# Altium integrated library Weidmueller_OMNIMATE_Signal.IntLib: 2550 symbols (part 24 of 45)
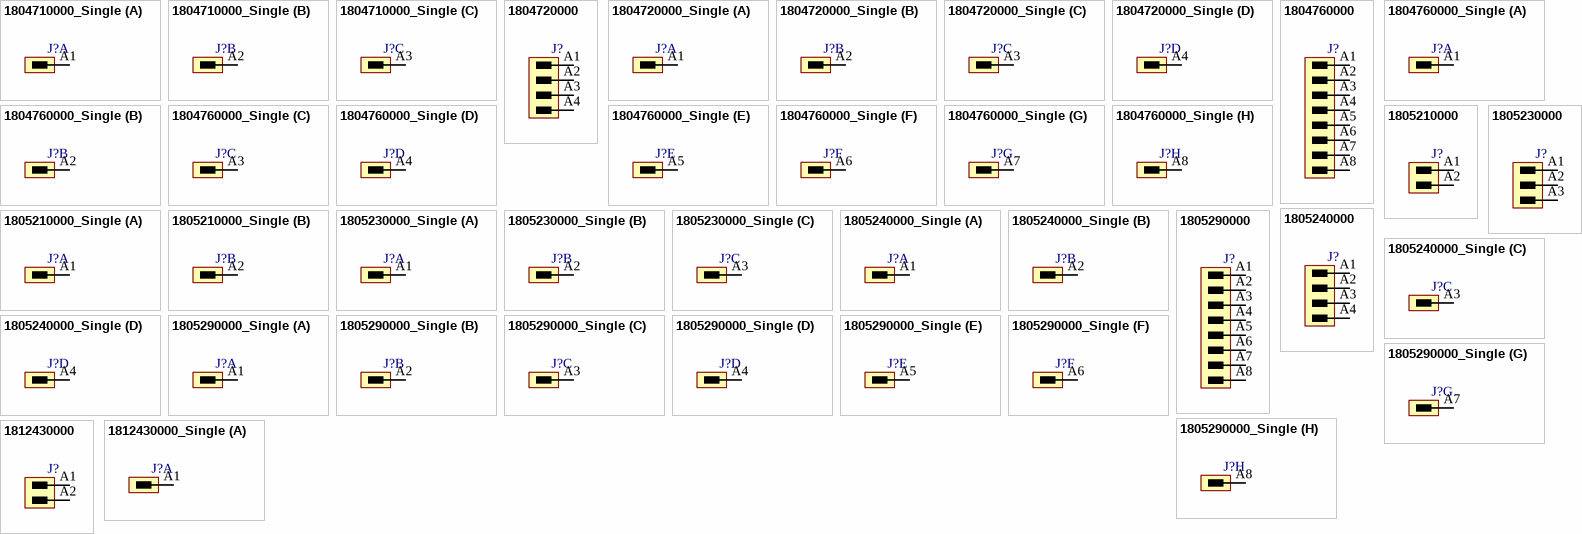
[diagram p234: symbols 1804710000_Single to 1812430000_Single]

## 1804760000_Single
designator J?
OMNIMATE Signal - series BL/SL 3.50; PartNumber: 1804760000; Manufacturer: Weidmueller; Short_text_for_material: SL-SMT 3.50/08/180LF 1.5SN BK BX; Side_termination_characteristic: Solder flange; Mounting_onto_the_PCB: Reflow solder connection; Pitch_mm: 3.5 mm; Pitch_inch: 0.138 inch; No_of_poles: 8; Outgoing_elbow: 180°; Solder_pin_length_mm: 1.5 mm; Contact_material: CuSn; Contact_surface: tinned; Insulating_material: LCP GF; UL_94_flammability_rating: V-0; Rated_voltage_for_surge_voltage_class_pollution_degree_II_2: 320 V; Rated_current_min_no_of_poles_TU_20_deg_C: 19 A; Rated_voltage_use_group_B_UL_1059: 300 V; Rated_current_use_group_B_UL_1059: 10 A; PackageReference: SL_SMT_3_5_180LF_08; Colour: Black; Packaging: Box; Qty: 50 PCS; Revision: V1; ComponentLink1Description: Manufacturer URL; ComponentLink1URL: http://www.weidmueller.com/; ComponentLink2Description: URL Link1; ComponentLink2URL: http://catalog.weidmueller.com/catalog/Start.do?localeId=en&ObjectID=1804760000
footprint SL_SMT_3_5_180LF_08 (OMNIMATE Signal - Serie BL/SL 3.50  SL-SMT 3.50/08/180LF 1.5)
part A pins: A1
part B pins: A2
part C pins: A3
part D pins: A4
part E pins: A5
part F pins: A6
part G pins: A7
part H pins: A8

## 1805210000
designator J?
OMNIMATE Signal - series BL/SL 3.50; PartNumber: 1805210000; Manufacturer: Weidmueller; Short_text_for_material: SL-SMT 3.50/02/180LF 1.5SN BK RL; Side_termination_characteristic: Solder flange; Mounting_onto_the_PCB: Reflow solder connection; Pitch_mm: 3.5 mm; Pitch_inch: 0.138 inch; No_of_poles: 2; Outgoing_elbow: 180°; Solder_pin_length_mm: 1.5 mm; Contact_material: CuSn; Contact_surface: tinned; Insulating_material: LCP GF; UL_94_flammability_rating: V-0; Rated_voltage_for_surge_voltage_class_pollution_degree_II_2: 320 V; Rated_current_min_no_of_poles_TU_20_deg_C: 15 A; Rated_voltage_use_group_B_UL_1059: 300 V; Rated_current_use_group_B_UL_1059: 10 A; PackageReference: SL_SMT_3_5_180LF_02; Colour: Black; Packaging: Tape; Qty: 265 PCS; Revision: V1; ComponentLink1Description: Manufacturer URL; ComponentLink1URL: http://www.weidmueller.com/; ComponentLink2Description: URL Link1; ComponentLink2URL: http://catalog.weidmueller.com/catalog/Start.do?localeId=en&ObjectID=1805210000
footprint SL_SMT_3_5_180LF_02 (OMNIMATE Signal - Serie BL/SL 3.50  SL-SMT 3.50/02/180LF 1.5)
pins: A1, A2

## 1805210000_Single
designator J?
OMNIMATE Signal - series BL/SL 3.50; PartNumber: 1805210000; Manufacturer: Weidmueller; Short_text_for_material: SL-SMT 3.50/02/180LF 1.5SN BK RL; Side_termination_characteristic: Solder flange; Mounting_onto_the_PCB: Reflow solder connection; Pitch_mm: 3.5 mm; Pitch_inch: 0.138 inch; No_of_poles: 2; Outgoing_elbow: 180°; Solder_pin_length_mm: 1.5 mm; Contact_material: CuSn; Contact_surface: tinned; Insulating_material: LCP GF; UL_94_flammability_rating: V-0; Rated_voltage_for_surge_voltage_class_pollution_degree_II_2: 320 V; Rated_current_min_no_of_poles_TU_20_deg_C: 15 A; Rated_voltage_use_group_B_UL_1059: 300 V; Rated_current_use_group_B_UL_1059: 10 A; PackageReference: SL_SMT_3_5_180LF_02; Colour: Black; Packaging: Tape; Qty: 265 PCS; Revision: V1; ComponentLink1Description: Manufacturer URL; ComponentLink1URL: http://www.weidmueller.com/; ComponentLink2Description: URL Link1; ComponentLink2URL: http://catalog.weidmueller.com/catalog/Start.do?localeId=en&ObjectID=1805210000
footprint SL_SMT_3_5_180LF_02 (OMNIMATE Signal - Serie BL/SL 3.50  SL-SMT 3.50/02/180LF 1.5)
part A pins: A1
part B pins: A2

## 1805230000
designator J?
OMNIMATE Signal - series BL/SL 3.50; PartNumber: 1805230000; Manufacturer: Weidmueller; Short_text_for_material: SL-SMT 3.50/03/180LF 1.5SN BK RL; Side_termination_characteristic: Solder flange; Mounting_onto_the_PCB: Reflow solder connection; Pitch_mm: 3.5 mm; Pitch_inch: 0.138 inch; No_of_poles: 3; Outgoing_elbow: 180°; Solder_pin_length_mm: 1.5 mm; Contact_surface: tinned; Insulating_material: LCP GF; UL_94_flammability_rating: V-0; Rated_voltage_for_surge_voltage_class_pollution_degree_II_2: 320 V; Rated_current_min_no_of_poles_TU_20_deg_C: 15 A; Rated_voltage_use_group_B_UL_1059: 300 V; Rated_current_use_group_B_UL_1059: 10 A; PackageReference: SL_SMT_3_5_180LF_03; Colour: Black; Packaging: Tape; Qty: 265 PCS; Revision: V1; ComponentLink1Description: Manufacturer URL; ComponentLink1URL: http://www.weidmueller.com/; ComponentLink2Description: URL Link1; ComponentLink2URL: http://catalog.weidmueller.com/catalog/Start.do?localeId=en&ObjectID=1805230000
footprint SL_SMT_3_5_180LF_03 (OMNIMATE Signal - Serie BL/SL 3.50  SL-SMT 3.50/03/180LF 1.5)
pins: A1, A2, A3

## 1805230000_Single
designator J?
OMNIMATE Signal - series BL/SL 3.50; PartNumber: 1805230000; Manufacturer: Weidmueller; Short_text_for_material: SL-SMT 3.50/03/180LF 1.5SN BK RL; Side_termination_characteristic: Solder flange; Mounting_onto_the_PCB: Reflow solder connection; Pitch_mm: 3.5 mm; Pitch_inch: 0.138 inch; No_of_poles: 3; Outgoing_elbow: 180°; Solder_pin_length_mm: 1.5 mm; Contact_surface: tinned; Insulating_material: LCP GF; UL_94_flammability_rating: V-0; Rated_voltage_for_surge_voltage_class_pollution_degree_II_2: 320 V; Rated_current_min_no_of_poles_TU_20_deg_C: 15 A; Rated_voltage_use_group_B_UL_1059: 300 V; Rated_current_use_group_B_UL_1059: 10 A; PackageReference: SL_SMT_3_5_180LF_03; Colour: Black; Packaging: Tape; Qty: 265 PCS; Revision: V1; ComponentLink1Description: Manufacturer URL; ComponentLink1URL: http://www.weidmueller.com/; ComponentLink2Description: URL Link1; ComponentLink2URL: http://catalog.weidmueller.com/catalog/Start.do?localeId=en&ObjectID=1805230000
footprint SL_SMT_3_5_180LF_03 (OMNIMATE Signal - Serie BL/SL 3.50  SL-SMT 3.50/03/180LF 1.5)
part A pins: A1
part B pins: A2
part C pins: A3

## 1805240000
designator J?
OMNIMATE Signal - series BL/SL 3.50; PartNumber: 1805240000; Manufacturer: Weidmueller; Short_text_for_material: SL-SMT 3.50/04/180LF 1.5SN BK RL; Side_termination_characteristic: Solder flange; Mounting_onto_the_PCB: Reflow solder connection; Pitch_mm: 3.5 mm; Pitch_inch: 0.138 inch; No_of_poles: 4; Outgoing_elbow: 180°; Solder_pin_length_mm: 1.5 mm; Contact_surface: tinned; Insulating_material: LCP GF; UL_94_flammability_rating: V-0; Rated_voltage_for_surge_voltage_class_pollution_degree_II_2: 320 V; Rated_current_min_no_of_poles_TU_20_deg_C: 15 A; Rated_voltage_use_group_B_UL_1059: 300 V; Rated_current_use_group_B_UL_1059: 10 A; PackageReference: SL_SMT_3_5_180LF_04; Colour: Black; Packaging: Tape; Qty: 265 PCS; Revision: V1; ComponentLink1Description: Manufacturer URL; ComponentLink1URL: http://www.weidmueller.com/; ComponentLink2Description: URL Link1; ComponentLink2URL: http://catalog.weidmueller.com/catalog/Start.do?localeId=en&ObjectID=1805240000
footprint SL_SMT_3_5_180LF_04 (OMNIMATE Signal - Serie BL/SL 3.50  SL-SMT 3.50/04/180LF 1.5)
pins: A1, A2, A3, A4

## 1805240000_Single
designator J?
OMNIMATE Signal - series BL/SL 3.50; PartNumber: 1805240000; Manufacturer: Weidmueller; Short_text_for_material: SL-SMT 3.50/04/180LF 1.5SN BK RL; Side_termination_characteristic: Solder flange; Mounting_onto_the_PCB: Reflow solder connection; Pitch_mm: 3.5 mm; Pitch_inch: 0.138 inch; No_of_poles: 4; Outgoing_elbow: 180°; Solder_pin_length_mm: 1.5 mm; Contact_surface: tinned; Insulating_material: LCP GF; UL_94_flammability_rating: V-0; Rated_voltage_for_surge_voltage_class_pollution_degree_II_2: 320 V; Rated_current_min_no_of_poles_TU_20_deg_C: 15 A; Rated_voltage_use_group_B_UL_1059: 300 V; Rated_current_use_group_B_UL_1059: 10 A; PackageReference: SL_SMT_3_5_180LF_04; Colour: Black; Packaging: Tape; Qty: 265 PCS; Revision: V1; ComponentLink1Description: Manufacturer URL; ComponentLink1URL: http://www.weidmueller.com/; ComponentLink2Description: URL Link1; ComponentLink2URL: http://catalog.weidmueller.com/catalog/Start.do?localeId=en&ObjectID=1805240000
footprint SL_SMT_3_5_180LF_04 (OMNIMATE Signal - Serie BL/SL 3.50  SL-SMT 3.50/04/180LF 1.5)
part A pins: A1
part B pins: A2
part C pins: A3
part D pins: A4

## 1805290000
designator J?
OMNIMATE Signal - series BL/SL 3.50; PartNumber: 1805290000; Manufacturer: Weidmueller; Short_text_for_material: SL-SMT 3.50/08/180LF 1.5SN BK RL; Side_termination_characteristic: Solder flange; Mounting_onto_the_PCB: Reflow solder connection; Pitch_mm: 3.5 mm; Pitch_inch: 0.138 inch; No_of_poles: 8; Outgoing_elbow: 180°; Solder_pin_length_mm: 1.5 mm; Contact_surface: tinned; Insulating_material: LCP GF; UL_94_flammability_rating: V-0; Rated_voltage_for_surge_voltage_class_pollution_degree_II_2: 320 V; Rated_current_min_no_of_poles_TU_20_deg_C: 15 A; Rated_voltage_use_group_B_UL_1059: 300 V; Rated_current_use_group_B_UL_1059: 10 A; PackageReference: SL_SMT_3_5_180LF_08; Colour: Black; Packaging: Tape; Qty: 265 PCS; Revision: V1; ComponentLink1Description: Manufacturer URL; ComponentLink1URL: http://www.weidmueller.com/; ComponentLink2Description: URL Link1; ComponentLink2URL: http://catalog.weidmueller.com/catalog/Start.do?localeId=en&ObjectID=1805290000
footprint SL_SMT_3_5_180LF_08 (OMNIMATE Signal - Serie BL/SL 3.50  SL-SMT 3.50/08/180LF 1.5)
pins: A1, A2, A3, A4, A5, A6, A7, A8

## 1805290000_Single
designator J?
OMNIMATE Signal - series BL/SL 3.50; PartNumber: 1805290000; Manufacturer: Weidmueller; Short_text_for_material: SL-SMT 3.50/08/180LF 1.5SN BK RL; Side_termination_characteristic: Solder flange; Mounting_onto_the_PCB: Reflow solder connection; Pitch_mm: 3.5 mm; Pitch_inch: 0.138 inch; No_of_poles: 8; Outgoing_elbow: 180°; Solder_pin_length_mm: 1.5 mm; Contact_surface: tinned; Insulating_material: LCP GF; UL_94_flammability_rating: V-0; Rated_voltage_for_surge_voltage_class_pollution_degree_II_2: 320 V; Rated_current_min_no_of_poles_TU_20_deg_C: 15 A; Rated_voltage_use_group_B_UL_1059: 300 V; Rated_current_use_group_B_UL_1059: 10 A; PackageReference: SL_SMT_3_5_180LF_08; Colour: Black; Packaging: Tape; Qty: 265 PCS; Revision: V1; ComponentLink1Description: Manufacturer URL; ComponentLink1URL: http://www.weidmueller.com/; ComponentLink2Description: URL Link1; ComponentLink2URL: http://catalog.weidmueller.com/catalog/Start.do?localeId=en&ObjectID=1805290000
footprint SL_SMT_3_5_180LF_08 (OMNIMATE Signal - Serie BL/SL 3.50  SL-SMT 3.50/08/180LF 1.5)
part A pins: A1
part B pins: A2
part C pins: A3
part D pins: A4
part E pins: A5
part F pins: A6
part G pins: A7
part H pins: A8

## 1812430000
designator J?
OMNIMATE Signal - series BL/SL 5.08; PartNumber: 1812430000; Manufacturer: Weidmueller; Short_text_for_material: SL-SMART 5.0X/02/90 1.5SN BK RL; Side_termination_characteristic: open side; Mounting_onto_the_PCB: Reflow solder connection; Pitch_mm: 5 mm; Pitch_inch: 0.197 inch; No_of_poles: 2; Outgoing_elbow: 90°; Solder_pin_length_mm: 1.5 mm; Contact_material: CuSn; Contact_surface: tinned; Insulating_material: LCP GF; UL_94_flammability_rating: V-0; Rated_voltage_for_surge_voltage_class_pollution_degree_II_2: 400 V; Rated_current_min_no_of_poles_TU_20_deg_C: 19 A; Rated_voltage_use_group_B_UL_1059: 300 V; Rated_current_use_group_B_UL_1059: 15 A; PackageReference: SL_SMarT_5_0x_90_02; Colour: Black; Packaging: Tape; Qty: 350 PCS; Revision: V1; ComponentLink1Description: Manufacturer URL; ComponentLink1URL: http://www.weidmueller.com/; ComponentLink2Description: URL Link1; ComponentLink2URL: http://catalog.weidmueller.com/catalog/Start.do?localeId=en&ObjectID=1812430000
footprint SL_SMarT_5_0x_90_02 (OMNIMATE Signal - Serie BL/SL 5.08  SL-SMART 5.0X/02/90 1.5)
pins: A1, A2

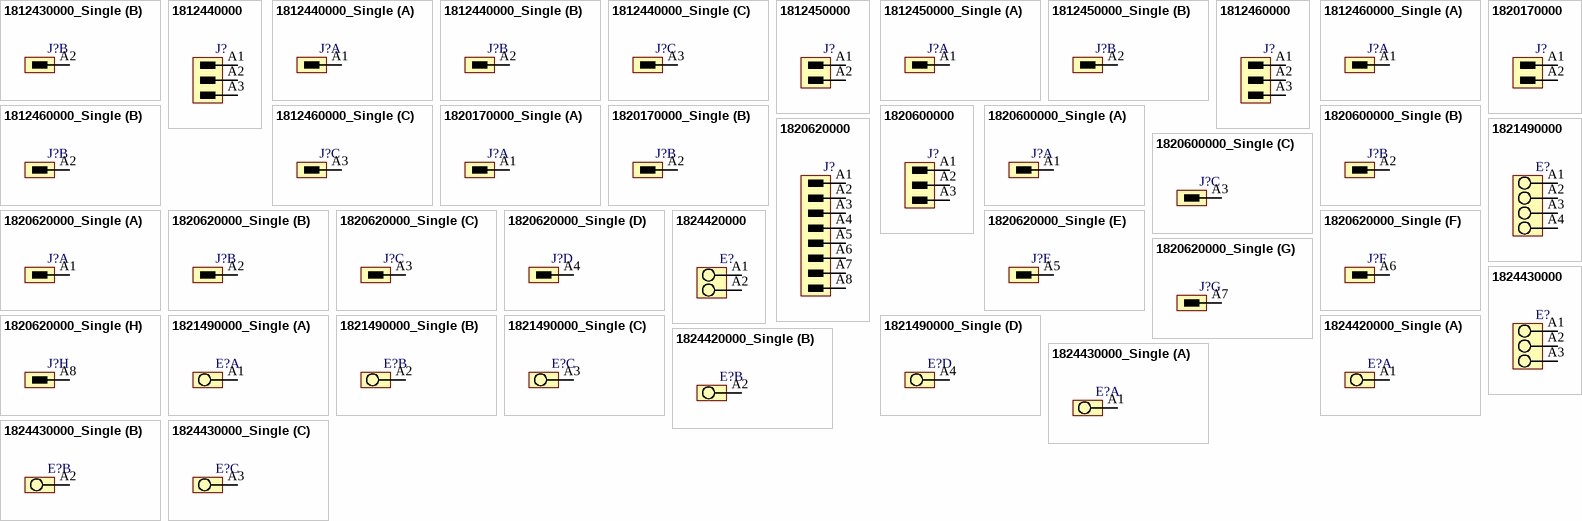
[diagram p126: symbols 1812430000_Single to 1824430000_Single]

## 1812430000_Single
designator J?
OMNIMATE Signal - series BL/SL 5.08; PartNumber: 1812430000; Manufacturer: Weidmueller; Short_text_for_material: SL-SMART 5.0X/02/90 1.5SN BK RL; Side_termination_characteristic: open side; Mounting_onto_the_PCB: Reflow solder connection; Pitch_mm: 5 mm; Pitch_inch: 0.197 inch; No_of_poles: 2; Outgoing_elbow: 90°; Solder_pin_length_mm: 1.5 mm; Contact_material: CuSn; Contact_surface: tinned; Insulating_material: LCP GF; UL_94_flammability_rating: V-0; Rated_voltage_for_surge_voltage_class_pollution_degree_II_2: 400 V; Rated_current_min_no_of_poles_TU_20_deg_C: 19 A; Rated_voltage_use_group_B_UL_1059: 300 V; Rated_current_use_group_B_UL_1059: 15 A; PackageReference: SL_SMarT_5_0x_90_02; Colour: Black; Packaging: Tape; Qty: 350 PCS; Revision: V1; ComponentLink1Description: Manufacturer URL; ComponentLink1URL: http://www.weidmueller.com/; ComponentLink2Description: URL Link1; ComponentLink2URL: http://catalog.weidmueller.com/catalog/Start.do?localeId=en&ObjectID=1812430000
footprint SL_SMarT_5_0x_90_02 (OMNIMATE Signal - Serie BL/SL 5.08  SL-SMART 5.0X/02/90 1.5)
part A pins: A1
part B pins: A2

## 1812440000
designator J?
OMNIMATE Signal - series BL/SL 5.08; PartNumber: 1812440000; Manufacturer: Weidmueller; Short_text_for_material: SL-SMART 5.0X/03/90 1.5SN BK RL; Side_termination_characteristic: open side; Mounting_onto_the_PCB: Reflow solder connection; Pitch_mm: 5 mm; Pitch_inch: 0.197 inch; No_of_poles: 3; Outgoing_elbow: 90°; Solder_pin_length_mm: 1.5 mm; Contact_material: CuSn; Contact_surface: tinned; Insulating_material: LCP GF; UL_94_flammability_rating: V-0; Rated_voltage_for_surge_voltage_class_pollution_degree_II_2: 400 V; Rated_current_min_no_of_poles_TU_20_deg_C: 19 A; Rated_voltage_use_group_B_UL_1059: 300 V; Rated_current_use_group_B_UL_1059: 15 A; PackageReference: SL_SMarT_5_0x_90_03; Colour: Black; Packaging: Tape; Qty: 350 PCS; Revision: V1; ComponentLink1Description: Manufacturer URL; ComponentLink1URL: http://www.weidmueller.com/; ComponentLink2Description: URL Link1; ComponentLink2URL: http://catalog.weidmueller.com/catalog/Start.do?localeId=en&ObjectID=1812440000
footprint SL_SMarT_5_0x_90_03 (OMNIMATE Signal - Serie BL/SL 5.08  SL-SMART 5.0X/03/90 1.5)
pins: A1, A2, A3

## 1812440000_Single
designator J?
OMNIMATE Signal - series BL/SL 5.08; PartNumber: 1812440000; Manufacturer: Weidmueller; Short_text_for_material: SL-SMART 5.0X/03/90 1.5SN BK RL; Side_termination_characteristic: open side; Mounting_onto_the_PCB: Reflow solder connection; Pitch_mm: 5 mm; Pitch_inch: 0.197 inch; No_of_poles: 3; Outgoing_elbow: 90°; Solder_pin_length_mm: 1.5 mm; Contact_material: CuSn; Contact_surface: tinned; Insulating_material: LCP GF; UL_94_flammability_rating: V-0; Rated_voltage_for_surge_voltage_class_pollution_degree_II_2: 400 V; Rated_current_min_no_of_poles_TU_20_deg_C: 19 A; Rated_voltage_use_group_B_UL_1059: 300 V; Rated_current_use_group_B_UL_1059: 15 A; PackageReference: SL_SMarT_5_0x_90_03; Colour: Black; Packaging: Tape; Qty: 350 PCS; Revision: V1; ComponentLink1Description: Manufacturer URL; ComponentLink1URL: http://www.weidmueller.com/; ComponentLink2Description: URL Link1; ComponentLink2URL: http://catalog.weidmueller.com/catalog/Start.do?localeId=en&ObjectID=1812440000
footprint SL_SMarT_5_0x_90_03 (OMNIMATE Signal - Serie BL/SL 5.08  SL-SMART 5.0X/03/90 1.5)
part A pins: A1
part B pins: A2
part C pins: A3

## 1812450000
designator J?
OMNIMATE Signal - series BL/SL 5.08; PartNumber: 1812450000; Manufacturer: Weidmueller; Short_text_for_material: SL-SMART 5.0X/02/180 1.5SN BK RL; Side_termination_characteristic: open side; Mounting_onto_the_PCB: Reflow solder connection; Pitch_mm: 5 mm; Pitch_inch: 0.197 inch; No_of_poles: 2; Outgoing_elbow: 180°; Solder_pin_length_mm: 1.5 mm; Contact_material: CuSn; Contact_surface: tinned; Insulating_material: LCP GF; UL_94_flammability_rating: V-0; Rated_voltage_for_surge_voltage_class_pollution_degree_II_2: 400 V; Rated_current_min_no_of_poles_TU_20_deg_C: 19 A; Rated_voltage_use_group_B_UL_1059: 300 V; Rated_current_use_group_B_UL_1059: 15 A; PackageReference: SL_SMarT_5_0x_180_02; Colour: Black; Packaging: Tape; Qty: 270 PCS; Revision: V1; ComponentLink1Description: Manufacturer URL; ComponentLink1URL: http://www.weidmueller.com/; ComponentLink2Description: URL Link1; ComponentLink2URL: http://catalog.weidmueller.com/catalog/Start.do?localeId=en&ObjectID=1812450000
footprint SL_SMarT_5_0x_180_02 (OMNIMATE Signal - Serie BL/SL 5.08  SL-SMART 5.0X/02/180 1.5)
pins: A1, A2

## 1812450000_Single
designator J?
OMNIMATE Signal - series BL/SL 5.08; PartNumber: 1812450000; Manufacturer: Weidmueller; Short_text_for_material: SL-SMART 5.0X/02/180 1.5SN BK RL; Side_termination_characteristic: open side; Mounting_onto_the_PCB: Reflow solder connection; Pitch_mm: 5 mm; Pitch_inch: 0.197 inch; No_of_poles: 2; Outgoing_elbow: 180°; Solder_pin_length_mm: 1.5 mm; Contact_material: CuSn; Contact_surface: tinned; Insulating_material: LCP GF; UL_94_flammability_rating: V-0; Rated_voltage_for_surge_voltage_class_pollution_degree_II_2: 400 V; Rated_current_min_no_of_poles_TU_20_deg_C: 19 A; Rated_voltage_use_group_B_UL_1059: 300 V; Rated_current_use_group_B_UL_1059: 15 A; PackageReference: SL_SMarT_5_0x_180_02; Colour: Black; Packaging: Tape; Qty: 270 PCS; Revision: V1; ComponentLink1Description: Manufacturer URL; ComponentLink1URL: http://www.weidmueller.com/; ComponentLink2Description: URL Link1; ComponentLink2URL: http://catalog.weidmueller.com/catalog/Start.do?localeId=en&ObjectID=1812450000
footprint SL_SMarT_5_0x_180_02 (OMNIMATE Signal - Serie BL/SL 5.08  SL-SMART 5.0X/02/180 1.5)
part A pins: A1
part B pins: A2

## 1812460000
designator J?
OMNIMATE Signal - series BL/SL 5.08; PartNumber: 1812460000; Manufacturer: Weidmueller; Short_text_for_material: SL-SMART 5.0X/03/180 1.5SN BK RL; Side_termination_characteristic: open side; Mounting_onto_the_PCB: Reflow solder connection; Pitch_mm: 5 mm; Pitch_inch: 0.197 inch; No_of_poles: 3; Outgoing_elbow: 180°; Solder_pin_length_mm: 1.5 mm; Contact_material: CuSn; Contact_surface: tinned; Insulating_material: LCP GF; UL_94_flammability_rating: V-0; Rated_voltage_for_surge_voltage_class_pollution_degree_II_2: 400 V; Rated_current_min_no_of_poles_TU_20_deg_C: 19 A; Rated_voltage_use_group_B_UL_1059: 300 V; Rated_current_use_group_B_UL_1059: 15 A; PackageReference: SL_SMarT_5_0x_180_03; Colour: Black; Packaging: Tape; Qty: 270 PCS; Revision: V1; ComponentLink1Description: Manufacturer URL; ComponentLink1URL: http://www.weidmueller.com/; ComponentLink2Description: URL Link1; ComponentLink2URL: http://catalog.weidmueller.com/catalog/Start.do?localeId=en&ObjectID=1812460000
footprint SL_SMarT_5_0x_180_03 (OMNIMATE Signal - Serie BL/SL 5.08  SL-SMART 5.0X/03/180 1.5)
pins: A1, A2, A3

## 1812460000_Single
designator J?
OMNIMATE Signal - series BL/SL 5.08; PartNumber: 1812460000; Manufacturer: Weidmueller; Short_text_for_material: SL-SMART 5.0X/03/180 1.5SN BK RL; Side_termination_characteristic: open side; Mounting_onto_the_PCB: Reflow solder connection; Pitch_mm: 5 mm; Pitch_inch: 0.197 inch; No_of_poles: 3; Outgoing_elbow: 180°; Solder_pin_length_mm: 1.5 mm; Contact_material: CuSn; Contact_surface: tinned; Insulating_material: LCP GF; UL_94_flammability_rating: V-0; Rated_voltage_for_surge_voltage_class_pollution_degree_II_2: 400 V; Rated_current_min_no_of_poles_TU_20_deg_C: 19 A; Rated_voltage_use_group_B_UL_1059: 300 V; Rated_current_use_group_B_UL_1059: 15 A; PackageReference: SL_SMarT_5_0x_180_03; Colour: Black; Packaging: Tape; Qty: 270 PCS; Revision: V1; ComponentLink1Description: Manufacturer URL; ComponentLink1URL: http://www.weidmueller.com/; ComponentLink2Description: URL Link1; ComponentLink2URL: http://catalog.weidmueller.com/catalog/Start.do?localeId=en&ObjectID=1812460000
footprint SL_SMarT_5_0x_180_03 (OMNIMATE Signal - Serie BL/SL 5.08  SL-SMART 5.0X/03/180 1.5)
part A pins: A1
part B pins: A2
part C pins: A3

## 1820170000
designator J?
OMNIMATE Signal - series BL/SL 5.08; PartNumber: 1820170000; Manufacturer: Weidmueller; Short_text_for_material: SL-SMT 5.08/02/180G 1.5 SN BK RL; Side_termination_characteristic: closed side; Mounting_onto_the_PCB: Reflow solder connection; Pitch_mm: 5.08 mm; Pitch_inch: 0.2 inch; No_of_poles: 2; Outgoing_elbow: 180°; Solder_pin_length_mm: 1.5 mm; Contact_material: CuSn; Contact_surface: tinned; Insulating_material: LCP GF; UL_94_flammability_rating: V-0; Rated_voltage_for_surge_voltage_class_pollution_degree_II_2: 400 V; Rated_current_min_no_of_poles_TU_20_deg_C: 19 A; Rated_voltage_use_group_B_UL_1059: 300 V; Rated_current_use_group_B_UL_1059: 15 A; PackageReference: SL_SMT_5_08_180G_02; Colour: Black; Packaging: Tape; Qty: 250 PCS; Revision: V1; ComponentLink1Description: Manufacturer URL; ComponentLink1URL: http://www.weidmueller.com/; ComponentLink2Description: URL Link1; ComponentLink2URL: http://catalog.weidmueller.com/catalog/Start.do?localeId=en&ObjectID=1820170000
footprint SL_SMT_5_08_180G_02 (OMNIMATE Signal - Serie BL/SL 5.08  SL-SMT 5.08/02/180G 1.5)
pins: A1, A2

## 1820170000_Single
designator J?
OMNIMATE Signal - series BL/SL 5.08; PartNumber: 1820170000; Manufacturer: Weidmueller; Short_text_for_material: SL-SMT 5.08/02/180G 1.5 SN BK RL; Side_termination_characteristic: closed side; Mounting_onto_the_PCB: Reflow solder connection; Pitch_mm: 5.08 mm; Pitch_inch: 0.2 inch; No_of_poles: 2; Outgoing_elbow: 180°; Solder_pin_length_mm: 1.5 mm; Contact_material: CuSn; Contact_surface: tinned; Insulating_material: LCP GF; UL_94_flammability_rating: V-0; Rated_voltage_for_surge_voltage_class_pollution_degree_II_2: 400 V; Rated_current_min_no_of_poles_TU_20_deg_C: 19 A; Rated_voltage_use_group_B_UL_1059: 300 V; Rated_current_use_group_B_UL_1059: 15 A; PackageReference: SL_SMT_5_08_180G_02; Colour: Black; Packaging: Tape; Qty: 250 PCS; Revision: V1; ComponentLink1Description: Manufacturer URL; ComponentLink1URL: http://www.weidmueller.com/; ComponentLink2Description: URL Link1; ComponentLink2URL: http://catalog.weidmueller.com/catalog/Start.do?localeId=en&ObjectID=1820170000
footprint SL_SMT_5_08_180G_02 (OMNIMATE Signal - Serie BL/SL 5.08  SL-SMT 5.08/02/180G 1.5)
part A pins: A1
part B pins: A2

## 1820600000
designator J?
OMNIMATE Signal - series BL/SL 5.08; PartNumber: 1820600000; Manufacturer: Weidmueller; Short_text_for_material: SL-SMT 5.08/03/180F 3.2SN BK BX; Side_termination_characteristic: Flange; Mounting_onto_the_PCB: Reflow solder connection; Pitch_mm: 5.08 mm; Pitch_inch: 0.2 inch; No_of_poles: 3; Outgoing_elbow: 180°; Solder_pin_length_mm: 3.2 mm; Contact_material: CuSn; Contact_surface: tinned; Insulating_material: LCP GF; UL_94_flammability_rating: V-0; Rated_voltage_for_surge_voltage_class_pollution_degree_II_2: 400 V; Rated_current_min_no_of_poles_TU_20_deg_C: 19 A; Rated_voltage_use_group_B_UL_1059: 300 V; Rated_current_use_group_B_UL_1059: 15 A; PackageReference: SL_SMT_5_08_180F_03; Colour: Black; Packaging: Box; Qty: 100 PCS; Revision: V1; ComponentLink1Description: Manufacturer URL; ComponentLink1URL: http://www.weidmueller.com/; ComponentLink2Description: URL Link1; ComponentLink2URL: http://catalog.weidmueller.com/catalog/Start.do?localeId=en&ObjectID=1820600000
footprint SL_SMT_5_08_180F_03 (OMNIMATE Signal - Serie BL/SL 5.08  SL-SMT 5.08/03/180F 3.2)
pins: A1, A2, A3

## 1820600000_Single
designator J?
OMNIMATE Signal - series BL/SL 5.08; PartNumber: 1820600000; Manufacturer: Weidmueller; Short_text_for_material: SL-SMT 5.08/03/180F 3.2SN BK BX; Side_termination_characteristic: Flange; Mounting_onto_the_PCB: Reflow solder connection; Pitch_mm: 5.08 mm; Pitch_inch: 0.2 inch; No_of_poles: 3; Outgoing_elbow: 180°; Solder_pin_length_mm: 3.2 mm; Contact_material: CuSn; Contact_surface: tinned; Insulating_material: LCP GF; UL_94_flammability_rating: V-0; Rated_voltage_for_surge_voltage_class_pollution_degree_II_2: 400 V; Rated_current_min_no_of_poles_TU_20_deg_C: 19 A; Rated_voltage_use_group_B_UL_1059: 300 V; Rated_current_use_group_B_UL_1059: 15 A; PackageReference: SL_SMT_5_08_180F_03; Colour: Black; Packaging: Box; Qty: 100 PCS; Revision: V1; ComponentLink1Description: Manufacturer URL; ComponentLink1URL: http://www.weidmueller.com/; ComponentLink2Description: URL Link1; ComponentLink2URL: http://catalog.weidmueller.com/catalog/Start.do?localeId=en&ObjectID=1820600000
footprint SL_SMT_5_08_180F_03 (OMNIMATE Signal - Serie BL/SL 5.08  SL-SMT 5.08/03/180F 3.2)
part A pins: A1
part B pins: A2
part C pins: A3

## 1820620000
designator J?
OMNIMATE Signal - series BL/SL 5.08; PartNumber: 1820620000; Manufacturer: Weidmueller; Short_text_for_material: SL-SMT 5.08/08/180F 3.2SN BK BX; Side_termination_characteristic: Flange; Mounting_onto_the_PCB: Reflow solder connection; Pitch_mm: 5.08 mm; Pitch_inch: 0.2 inch; No_of_poles: 8; Outgoing_elbow: 180°; Solder_pin_length_mm: 3.2 mm; Contact_material: CuSn; Contact_surface: tinned; Insulating_material: LCP GF; UL_94_flammability_rating: V-0; Rated_voltage_for_surge_voltage_class_pollution_degree_II_2: 400 V; Rated_current_min_no_of_poles_TU_20_deg_C: 19 A; Rated_voltage_use_group_B_UL_1059: 300 V; Rated_current_use_group_B_UL_1059: 15 A; PackageReference: SL_SMT_5_08_180F_08; Colour: Black; Packaging: Box; Qty: 50 PCS; Revision: V1; ComponentLink1Description: Manufacturer URL; ComponentLink1URL: http://www.weidmueller.com/; ComponentLink2Description: URL Link1; ComponentLink2URL: http://catalog.weidmueller.com/catalog/Start.do?localeId=en&ObjectID=1820620000
footprint SL_SMT_5_08_180F_08 (OMNIMATE Signal - Serie BL/SL 5.08  SL-SMT 5.08/08/180F 3.2)
pins: A1, A2, A3, A4, A5, A6, A7, A8

## 1820620000_Single
designator J?
OMNIMATE Signal - series BL/SL 5.08; PartNumber: 1820620000; Manufacturer: Weidmueller; Short_text_for_material: SL-SMT 5.08/08/180F 3.2SN BK BX; Side_termination_characteristic: Flange; Mounting_onto_the_PCB: Reflow solder connection; Pitch_mm: 5.08 mm; Pitch_inch: 0.2 inch; No_of_poles: 8; Outgoing_elbow: 180°; Solder_pin_length_mm: 3.2 mm; Contact_material: CuSn; Contact_surface: tinned; Insulating_material: LCP GF; UL_94_flammability_rating: V-0; Rated_voltage_for_surge_voltage_class_pollution_degree_II_2: 400 V; Rated_current_min_no_of_poles_TU_20_deg_C: 19 A; Rated_voltage_use_group_B_UL_1059: 300 V; Rated_current_use_group_B_UL_1059: 15 A; PackageReference: SL_SMT_5_08_180F_08; Colour: Black; Packaging: Box; Qty: 50 PCS; Revision: V1; ComponentLink1Description: Manufacturer URL; ComponentLink1URL: http://www.weidmueller.com/; ComponentLink2Description: URL Link1; ComponentLink2URL: http://catalog.weidmueller.com/catalog/Start.do?localeId=en&ObjectID=1820620000
footprint SL_SMT_5_08_180F_08 (OMNIMATE Signal - Serie BL/SL 5.08  SL-SMT 5.08/08/180F 3.2)
part A pins: A1
part B pins: A2
part C pins: A3
part D pins: A4
part E pins: A5
part F pins: A6
part G pins: A7
part H pins: A8

## 1821490000
designator E?
OMNIMATE Signal - series LM; PartNumber: 1821490000; Manufacturer: Weidmueller; Short_text_for_material: LM 5.00/04/90 3.5SN OR BX; Side_termination_characteristic: closed side; Mounting_onto_the_PCB: Solder connection; Pitch_mm: 5 mm; Pitch_inch: 0,197 inch; No_of_poles: 4; Solder_pin_length_mm: 3,5 mm; Contact_material: Cu-Leg; Contact_surface: tinned; Insulating_material: Wemid (PA); UL_94_flammability_rating: V-0; Rated_voltage_for_surge_voltage_class_pollution_degree_II_2: 630 V; Rated_current_min_no_of_poles_TU_20_deg_C: 19 A; Solid_min_H05_07_V_U: 0,2 mm²; Solid_max_H05_07_V_U: 2,5 mm²; Rated_voltage_use_group_B_UL_1059: 300 V; Rated_current_use_group_B_UL_1059: 15 A; Wire_cross_section_AWG_min_UL_1059: AWG 24; Wire_cross_section_AWG_max_UL_1059: AWG 14; PackageReference: LM_5_00_90_04; Colour: Orange; Packaging: Box; Qty: 50 PCS; Revision: V1; ComponentLink1Description: Manufacturer URL; ComponentLink1URL: http://www.weidmueller.com/; ComponentLink2Description: URL Link1; ComponentLink2URL: http://catalog.weidmueller.com/catalog/Start.do?localeId=en&ObjectID=1821490000
footprint LM_5_00_90_04 (OMNIMATE Signal - Serie LM  LM 5.00/04/90 3.5)
pins: A1, A2, A3, A4
1 alternate drawing of the same symbol

## 1821490000_Single
designator E?
OMNIMATE Signal - series LM; PartNumber: 1821490000; Manufacturer: Weidmueller; Short_text_for_material: LM 5.00/04/90 3.5SN OR BX; Side_termination_characteristic: closed side; Mounting_onto_the_PCB: Solder connection; Pitch_mm: 5 mm; Pitch_inch: 0,197 inch; No_of_poles: 4; Solder_pin_length_mm: 3,5 mm; Contact_material: Cu-Leg; Contact_surface: tinned; Insulating_material: Wemid (PA); UL_94_flammability_rating: V-0; Rated_voltage_for_surge_voltage_class_pollution_degree_II_2: 630 V; Rated_current_min_no_of_poles_TU_20_deg_C: 19 A; Solid_min_H05_07_V_U: 0,2 mm²; Solid_max_H05_07_V_U: 2,5 mm²; Rated_voltage_use_group_B_UL_1059: 300 V; Rated_current_use_group_B_UL_1059: 15 A; Wire_cross_section_AWG_min_UL_1059: AWG 24; Wire_cross_section_AWG_max_UL_1059: AWG 14; PackageReference: LM_5_00_90_04; Colour: Orange; Packaging: Box; Qty: 50 PCS; Revision: V1; ComponentLink1Description: Manufacturer URL; ComponentLink1URL: http://www.weidmueller.com/; ComponentLink2Description: URL Link1; ComponentLink2URL: http://catalog.weidmueller.com/catalog/Start.do?localeId=en&ObjectID=1821490000
footprint LM_5_00_90_04 (OMNIMATE Signal - Serie LM  LM 5.00/04/90 3.5)
part A pins: A1
part B pins: A2
part C pins: A3
part D pins: A4
1 alternate drawing of the same symbol

## 1824420000
designator E?
OMNIMATE Signal - series LSF; PartNumber: 1824420000; Manufacturer: Weidmueller; Short_text_for_material: LSF-SMT 3.50/02/90 3.5SN BK TU; Side_termination_characteristic: closed side; Mounting_onto_the_PCB: Reflow solder connection; Pitch_mm: 3,5 mm; Pitch_inch: 0,138 inch; No_of_poles: 2; Contact_material: Cu-Leg; Contact_surface: tinned; Insulating_material: LCP GF; UL_94_flammability_rating: V-0; Rated_voltage_for_surge_voltage_class_pollution_degree_II_2: 320 V; Rated_current_min_no_of_poles_TU_20_deg_C: 19 A; Solid_min_H05_07_V_U: 0,2 mm²; Solid_max_H05_07_V_U: 1,5 mm²; Rated_voltage_use_group_B_UL_1059: 300 V; Rated_current_use_group_B_UL_1059: 12 A; Wire_cross_section_AWG_min_UL_1059: AWG 24; Wire_cross_section_AWG_max_UL_1059: AWG 16; PackageReference: LSF_SMT_3_5_90_02; Colour: Black; Solder_pin_length_mm: 3,5 mm; Packaging: Tube; Qty: 71 PCS; Revision: V1; ComponentLink1Description: Manufacturer URL; ComponentLink1URL: http://www.weidmueller.com/; ComponentLink2Description: URL Link1; ComponentLink2URL: http://catalog.weidmueller.com/catalog/Start.do?localeId=en&ObjectID=1824420000
footprint LSF_SMT_3_5_90_02 (OMNIMATE Signal - Serie LSF  LSF-SMT 3.50/02/90 3.5)
pins: A1, A2
1 alternate drawing of the same symbol

## 1824420000_Single
designator E?
OMNIMATE Signal - series LSF; PartNumber: 1824420000; Manufacturer: Weidmueller; Short_text_for_material: LSF-SMT 3.50/02/90 3.5SN BK TU; Side_termination_characteristic: closed side; Mounting_onto_the_PCB: Reflow solder connection; Pitch_mm: 3,5 mm; Pitch_inch: 0,138 inch; No_of_poles: 2; Contact_material: Cu-Leg; Contact_surface: tinned; Insulating_material: LCP GF; UL_94_flammability_rating: V-0; Rated_voltage_for_surge_voltage_class_pollution_degree_II_2: 320 V; Rated_current_min_no_of_poles_TU_20_deg_C: 19 A; Solid_min_H05_07_V_U: 0,2 mm²; Solid_max_H05_07_V_U: 1,5 mm²; Rated_voltage_use_group_B_UL_1059: 300 V; Rated_current_use_group_B_UL_1059: 12 A; Wire_cross_section_AWG_min_UL_1059: AWG 24; Wire_cross_section_AWG_max_UL_1059: AWG 16; PackageReference: LSF_SMT_3_5_90_02; Colour: Black; Solder_pin_length_mm: 3,5 mm; Packaging: Tube; Qty: 71 PCS; Revision: V1; ComponentLink1Description: Manufacturer URL; ComponentLink1URL: http://www.weidmueller.com/; ComponentLink2Description: URL Link1; ComponentLink2URL: http://catalog.weidmueller.com/catalog/Start.do?localeId=en&ObjectID=1824420000
footprint LSF_SMT_3_5_90_02 (OMNIMATE Signal - Serie LSF  LSF-SMT 3.50/02/90 3.5)
part A pins: A1
part B pins: A2
1 alternate drawing of the same symbol

## 1824430000
designator E?
OMNIMATE Signal - series LSF; PartNumber: 1824430000; Manufacturer: Weidmueller; Short_text_for_material: LSF-SMT 3.50/03/90 3.5SN BK TU; Side_termination_characteristic: closed side; Mounting_onto_the_PCB: Reflow solder connection; Pitch_mm: 3,5 mm; Pitch_inch: 0,138 inch; No_of_poles: 3; Contact_material: Cu-Leg; Contact_surface: tinned; Insulating_material: LCP GF; UL_94_flammability_rating: V-0; Rated_voltage_for_surge_voltage_class_pollution_degree_II_2: 320 V; Rated_current_min_no_of_poles_TU_20_deg_C: 19 A; Solid_min_H05_07_V_U: 0,2 mm²; Solid_max_H05_07_V_U: 1,5 mm²; Rated_voltage_use_group_B_UL_1059: 300 V; Rated_current_use_group_B_UL_1059: 12 A; Wire_cross_section_AWG_min_UL_1059: AWG 24; Wire_cross_section_AWG_max_UL_1059: AWG 16; PackageReference: LSF_SMT_3_5_90_03; Colour: Black; Solder_pin_length_mm: 3,5 mm; Packaging: Tube; Qty: 49 PCS; Revision: V1; ComponentLink1Description: Manufacturer URL; ComponentLink1URL: http://www.weidmueller.com/; ComponentLink2Description: URL Link1; ComponentLink2URL: http://catalog.weidmueller.com/catalog/Start.do?localeId=en&ObjectID=1824430000
footprint LSF_SMT_3_5_90_03 (OMNIMATE Signal - Serie LSF  LSF-SMT 3.50/03/90 3.5)
pins: A1, A2, A3
1 alternate drawing of the same symbol

## 1824430000_Single
designator E?